# Altium footprint library USRP2_Clone.PcbLib: 91 footprints (part 3 of 6)
Each footprint in its own frame and in the unit in brackets; x right, y up, seen from the top. Pads: shape width x height; smd on the part's side, far side on the other; paste and mask are expansions set on the pad; w line width, h text height; cw(c..) or ccw(c..) is an arc to the next point about the centre after c.
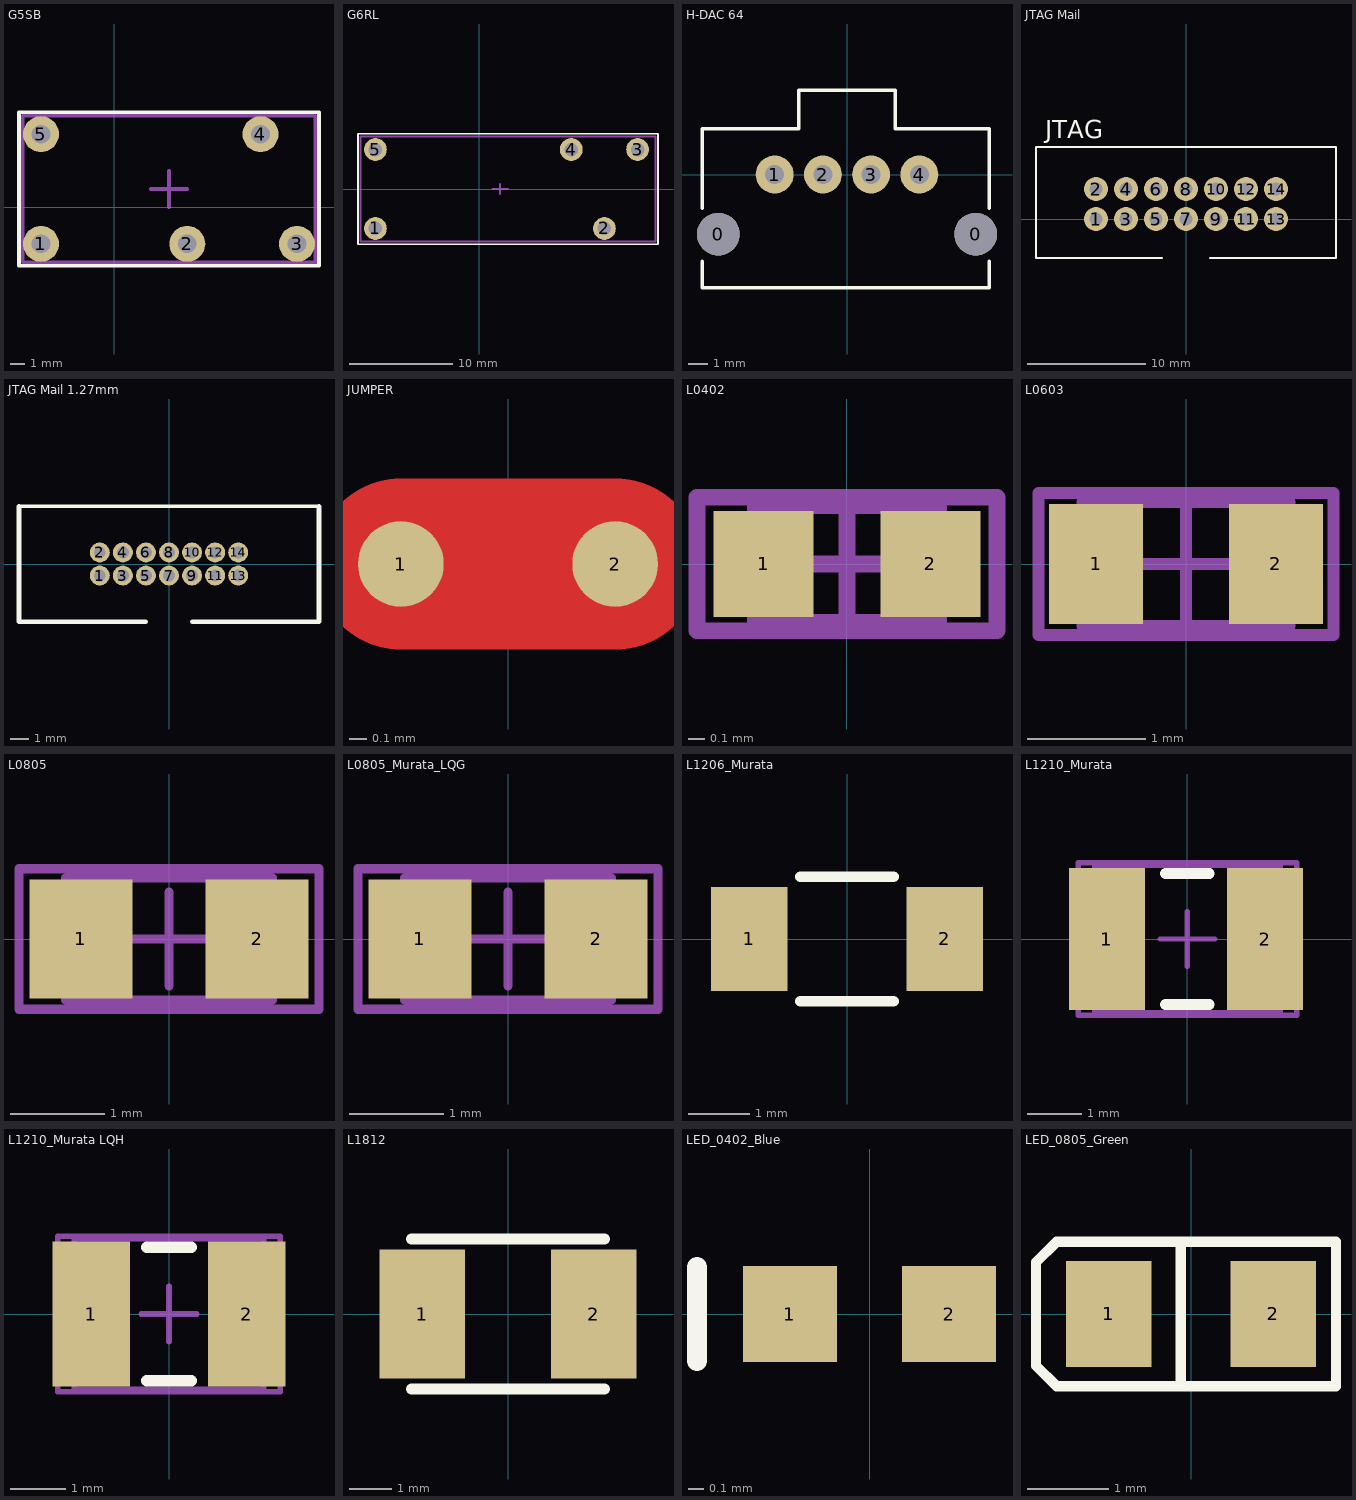
[diagram p2: the footprints below, top view; thin cyan lines are the x and y axes]

## G5SB [mm] "Compact Single-pole Relay"
height 15.8
pads (5):
  round 2.5 hole 1.3 unplated: 1(-5.08,-2.54) 2(5.08,-2.54) 3(12.7,-2.54) 4(10.16,5.08) 5(-5.08,5.08)
Top Overlay:
  lines w0.254: -6.604,-4.064 -6.604,6.604 14.224,6.604 14.224,-4.064 -6.604,-4.064
Mechanical 15:
  lines w0.254: 2.54,1.27 5.08,1.27 ; 3.81,0 3.81,2.54 ; -6.35,-3.81 13.843,-3.81 13.97,-3.937 13.97,6.35 -6.35,6.35 -6.35,-3.81
3D body "g5sb-14_5dc.stp": height 16, standoff -3.2, extent -6.34,-3.88 13.96,6.42

## G6RL [mm] "Low-profile power relay"
height 12.3
pads (5):
  round 2.2 hole 1.3: 1(-10,-3.81) 2(12.1,-3.81) 3(15.3,3.81) 4(8.9,3.81) 5(-10,3.81)
Top Overlay:
  lines w0.178: -11.684,-5.334 17.272,-5.334 17.272,5.334 -11.684,5.334 -11.684,-5.334
Mechanical 15:
  lines w0.178: 1.27,0 2.794,0 ; 2.032,-0.508 2.032,0.508 ; -11.43,-5.08 -11.43,5.08 17.018,5.08 17.018,-5.08 -11.43,-5.08
3D body "relay_g6rl-1_5dc.stp": height 12.45, standoff -3.05, extent -11.456,-5 17.044,5

## H-DAC 64 [mm]
height 25
pads (6):
  round 2.25 hole 2.25 unplated: 0(-6.78,-3.14) 0(6.78,-3.14)
  round 2 hole 1: 1(-3.81,0) 2(-1.27,0) 3(1.27,0) 4(3.81,0)
Top Overlay:
  lines w0.178: -7.62,-4.572 -7.62,-5.969 7.493,-5.969 7.493,-4.572 ; -7.62,-1.778 -7.62,0.032 -7.62,2.413 -2.54,2.413 -2.54,4.445 2.54,4.445 2.54,2.413 7.493,2.413 7.493,-1.778
3D body "311010040.stp": height 22.07, standoff -5.07, extent -8.098,-5.721 8.098,7.239

## JTAG Mail [mil]
height 114.17
pads (14):
  round 80 hole 42: 1(-300,0) 2(-300,100) 3(-200,0) 4(-200,100) 5(-100,0) 6(-100,100) 7(0,0) 8(0,100) 9(100,0) 10(100,100) 11(200,0) 12(200,100) 13(300,0) 14(300,100)
Top Overlay:
  lines w7.87: -80,-130 -500,-130 -500,240 500,240 500,-130 80,-130
  text "JTAG" at -470,270 h60
3D body "User Library-IDC Socket Male 14pin Straight THT Goldplated 2_54mm.step": height 363.39, standoff -124.8, extent -499.6,-117.32 499.61,231.11

## JTAG Mail 1.27mm [mm]
height 2.9
pads (14):
  round 1.1 hole 0.65: 1(-3.81,-0.635) 2(-3.81,0.635) 3(-2.54,-0.635) 4(-2.54,0.635) 5(-1.27,-0.635) 6(-1.27,0.635) 7(0,-0.635) 8(0,0.635) 9(1.27,-0.635) 10(1.27,0.635) 11(2.54,-0.635) 12(2.54,0.635) 13(3.81,-0.635) 14(3.81,0.635)
Top Overlay:
  lines w0.2: -8.255,3.175 8.255,3.175
  lines w0.254: -8.255,3.175 -8.255,-3.175 -1.27,-3.175 ; 1.27,-3.175 8.255,-3.175 8.255,3.175
3D body "User Library-CONB127P-2R-20W_TH.step": height 5.4, standoff -2.1, extent -7.595,-2.65 7.595,2.55

## JUMPER [mm]
pads (2):
  round 0.5 smd: 1(-0.625,0) 2(0.625,0)
Top Layer:
  lines w1: -0.625,0 0.625,0

## L0402 [mm] "Chip Capacitor, Body 1.0x0.5mm, IPC High Density"
height 1.3
pads (2):
  rect 0.6x0.635 smd: 1(-0.5,0) 2(0.5,0)
Mechanical 13:
  lines w0.1: -0.55,-0.35 0.55,-0.35 0.55,0.35 -0.55,0.35 -0.55,-0.35
Mechanical 15:
  lines w0.1: -0.3,0 0.3,0 ; 0,-0.4 0,0.4 ; -0.9,-0.4 0.9,-0.4 0.9,0.4 -0.9,0.4 -0.9,-0.4
3D body "User Library-Chip Inductor_0402.step": height 0.48, standoff -0.02, extent -0.5,-0.3 0.5,0.3

## L0603 [mil] "Chip Capacitor, Body 1.6x0.8mm, IPC High Density"
height 51.18
pads (2):
  rect 31.5x40 smd: 1(-30,0) 2(30,0)
Mechanical 13:
  lines w3.94: -34.45,-20.67 34.45,-20.67 34.45,20.67 -34.45,20.67 -34.45,-20.67
Mechanical 15:
  lines w3.94: -18.7,0 18.7,0 ; 0,-18.7 0,18.7 ; -49.21,-23.62 49.21,-23.62 49.21,23.62 -49.21,23.62 -49.21,-23.62
3D body "User Library-Chip Inductor_0603.step": height 30.75, standoff -0.75, extent -31.5,-18.7 31.5,18.7

## L0805 [mm] "Chip Capacitor, Body 2.0x1.3mm, IPC High Density"
height 1.4
pads (2):
  rect 1.1x1.27 smd: 1(-0.94,0) 2(0.94,0)
Mechanical 13:
  lines w0.1: -1.1,-0.65 1.1,-0.65 1.1,0.65 -1.1,0.65 -1.1,-0.65
Mechanical 15:
  lines w0.1: -0.5,0 0.5,0 ; 0,-0.5 0,0.5 ; -1.6,-0.75 1.6,-0.75 1.6,0.75 -1.6,0.75 -1.6,-0.75
3D body "User Library-Chip Inductor_0805.step": height 0.94, standoff -0.01, extent -1,-0.6 1,0.6

## L0805_Murata_LQG [mm] "Chip Capacitor, Body 2.0x1.3mm, IPC High Density"
height 1.4
pads (2):
  rect 1.1x1.27 smd: 1(-0.94,0) 2(0.94,0)
Mechanical 13:
  lines w0.1: -1.1,-0.65 -1.1,0.65 1.1,0.65 1.1,-0.65 -1.1,-0.65
Mechanical 15:
  lines w0.1: -0.5,0 0.5,0 ; 0,-0.5 0,0.5 ; -1.6,-0.75 -1.6,0.75 1.6,0.75 1.6,-0.75 -1.6,-0.75
3D body "User Library-ind_0805.step": height 0.95, standoff 0, extent -1,-0.6 1,0.6

## L1206_Murata [mm]
height 0.5
pads (2):
  rect 1.25x1.7 smd: 1(-1.6,0) 2(1.6,0)
Top Overlay:
  lines w0.178: -0.762,-1.016 0.762,-1.016 ; -0.762,1.016 0.762,1.016
3D body "User Library-V1206HD.STEP": height 1.5, standoff 0, extent -1.6,-0.8 1.6,0.8

## L1210_Murata [mm] "Chip Capacitor, Body 3.2x2.5mm, IPC High Density"
height 1.3
pads (2):
  rect 1.4x2.6 smd: 1(-1.473,0) 2(1.422,0)
Top Overlay:
  lines w0.2: -0.4,-1.2 0.4,-1.2 ; -0.4,1.2 0.4,1.2
Mechanical 13:
  lines w0.1: -1.7,-1.35 -1.7,1.35 1.7,1.35 1.7,-1.35 -1.7,-1.35
Mechanical 15:
  lines w0.1: -0.5,0 0.5,0 ; 0,-0.5 0,0.5 ; -2,-1.4 -2,1.4 2,1.4 2,-1.4 -2,-1.4
3D body "User Library-V1210HD.STEP": height 1.5, standoff 0, extent -1.6,-1.25 1.6,1.25

## L1210_Murata LQH [mm] "Power Lines Inductor"
height 1.3
pads (2):
  rect 1.4x2.6 smd: 1(-1.397,0) 2(1.397,0)
Top Overlay:
  lines w0.2: -0.4,-1.2 0.4,-1.2 ; -0.4,1.2 0.4,1.2
Mechanical 13:
  lines w0.1: -1.7,-1.35 1.7,-1.35 1.7,1.35 -1.7,1.35 -1.7,-1.35
Mechanical 15:
  lines w0.1: -0.5,0 0.5,0 ; 0,-0.5 0,0.5 ; -2,-1.4 2,-1.4 2,1.4 -2,1.4 -2,-1.4
3D body "User Library-LQH32PN_sw.step": height 1.55, standoff 0, extent -1.6,-1.25 1.6,1.25

## L1812 [mm]
height 1
pads (2):
  rect 2x3 smd: 1(-2,0) 2(2,0)
Top Overlay:
  lines w0.254: -2.25,-1.75 2.25,-1.75 ; -2.25,1.75 2.25,1.75
3D body "User Library-Chip Inductor_1812.step": height 1.75, standoff 0, extent -2.25,-1.6 2.25,1.6

## LED_0402_Blue [mil]
height 12.6
pads (2):
  rect 23.62x24 smd: 1(-20,0) 2(20,0)
Top Overlay:
  lines w5: -43.31,-11.81 -43.31,11.81
3D body "User Library-led_0402.step": height 17.72, standoff 0, extent -19.87,-9.84 19.89,9.85

## LED_0805_Green [mm]
height 1
pads (2):
  rect 1.05x1.3 smd: 1(-1.01,0) 2(1.01,0)
Top Overlay:
  lines w0.127: -0.127,-0.889 -0.127,0.889 ; -1.905,-0.635 -1.905,0.635 -1.651,0.889 1.778,0.889 1.778,-0.889 -1.651,-0.889 -1.905,-0.635
3D body "User Library-User Library-led_0805 GRE.step": height 1.1, standoff 0, extent -1.01,-0.625 1.01,0.625